# Altium footprint library SMPSProject.PcbLib: 143 footprints (part 4 of 9)
Each footprint in its own frame and in the unit in brackets; x right, y up, seen from the top. Pads: shape width x height; smd on the part's side, far side on the other; paste and mask are expansions set on the pad; w line width, h text height; cw(c..) or ccw(c..) is an arc to the next point about the centre after c.
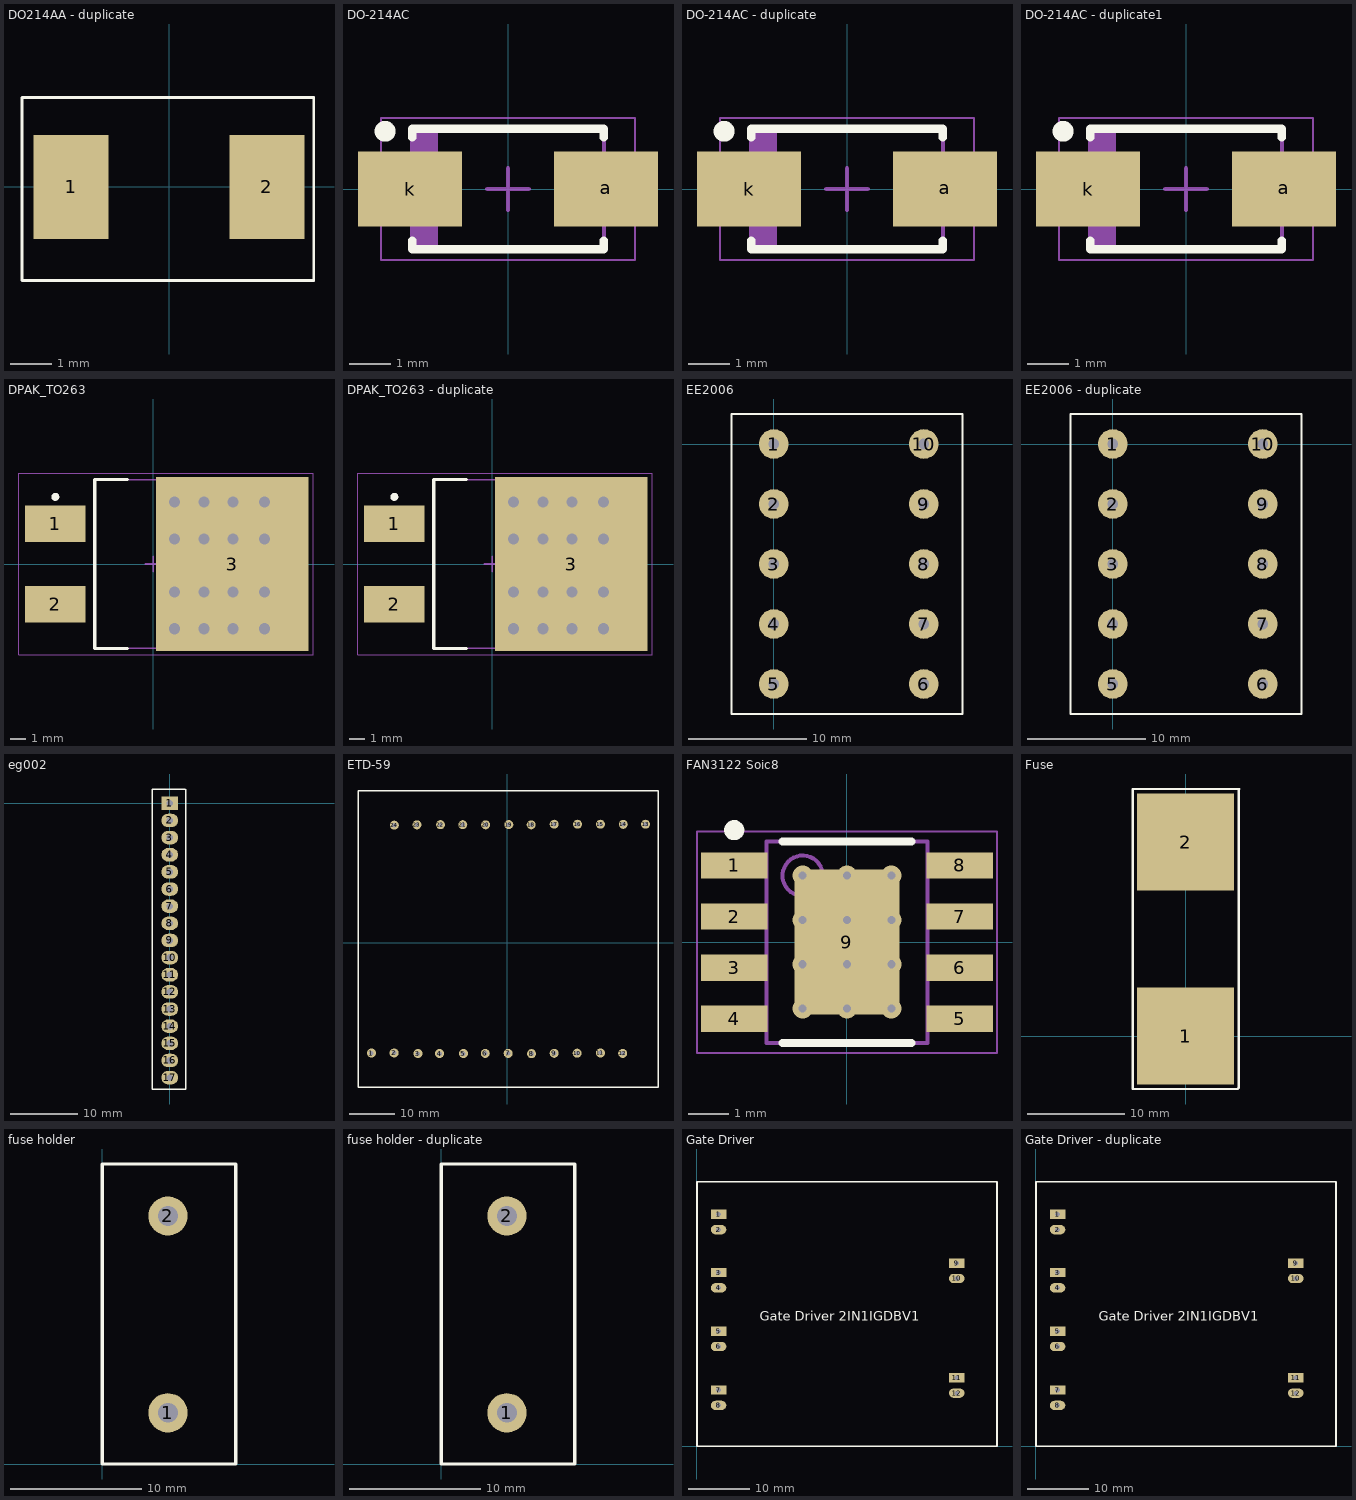
[diagram p3: the footprints below, top view; thin cyan lines are the x and y axes]

## DO214AA - duplicate [mm]
pads (2):
  rect 1.8x2.5 smd: 1(-2.35,0) 2(2.35,0)
Top Overlay:
  lines w0.07: -3.525,-2.25 -3.525,1.025 -3.525,2.15 3.475,2.15 3.475,-2.25 -3.525,-2.25
3D body "User Library-DO-214AA(SMB).STEP": height 2.48, standoff -0.35, extent -2.84,-2.025 2.838,1.925

## DO-214AC [mm]
height 1.35
pads (2):
  rect 2.5x1.8 smd: a(2.35,0) k(-2.35,0)
Top Overlay:
  circle w0.25: c-2.95,1.385 r0.125
  lines w0.2: -2.3,-1.235 -2.3,-1.45 2.3,-1.45 2.3,-1.235 ; -2.3,1.235 -2.3,1.45 2.3,1.45 2.3,1.235
Top Courtyard:
  lines w0.05: -3.05,-1.7 -3.05,1.7 3.05,1.7 3.05,-1.7 -3.05,-1.7
  lines w0.1: -0.5,0 0.5,0 ; 0,-0.5 0,0.5
Top Assembly:
  rectangle: -2.3,-1.45 -1.681,1.45
  lines w0.1: -2.3,-1.45 -2.3,1.45 2.3,1.45 2.3,-1.45 -2.3,-1.45
3D body "User Library-DO-214AC(SMA).STEP": height 2.3, standoff 0.01, extent -2.768,-1.422 2.718,1.372

## DO-214AC - duplicate [mm]
height 1.35
pads (2):
  rect 2.5x1.8 smd: a(2.35,0) k(-2.35,0)
Top Overlay:
  circle w0.25: c-2.95,1.385 r0.125
  lines w0.2: -2.3,-1.235 -2.3,-1.45 2.3,-1.45 2.3,-1.235 ; -2.3,1.235 -2.3,1.45 2.3,1.45 2.3,1.235
Top Courtyard:
  lines w0.05: -3.05,-1.7 -3.05,1.7 3.05,1.7 3.05,-1.7 -3.05,-1.7
  lines w0.1: -0.5,0 0.5,0 ; 0,-0.5 0,0.5
Top Assembly:
  rectangle: -2.3,-1.45 -1.681,1.45
  lines w0.1: -2.3,-1.45 -2.3,1.45 2.3,1.45 2.3,-1.45 -2.3,-1.45
3D body "User Library-DO-214AC(SMA).STEP": height 2.3, standoff 0.01, extent -2.768,-1.422 2.718,1.372

## DO-214AC - duplicate1 [mm]
height 1.35
pads (2):
  rect 2.5x1.8 smd: a(2.35,0) k(-2.35,0)
Top Overlay:
  circle w0.25: c-2.95,1.385 r0.125
  lines w0.2: -2.3,-1.235 -2.3,-1.45 2.3,-1.45 2.3,-1.235 ; -2.3,1.235 -2.3,1.45 2.3,1.45 2.3,1.235
Top Courtyard:
  lines w0.05: -3.05,-1.7 -3.05,1.7 3.05,1.7 3.05,-1.7 -3.05,-1.7
  lines w0.1: -0.5,0 0.5,0 ; 0,-0.5 0,0.5
Top Assembly:
  rectangle: -2.3,-1.45 -1.681,1.45
  lines w0.1: -2.3,-1.45 -2.3,1.45 2.3,1.45 2.3,-1.45 -2.3,-1.45
3D body "User Library-DO-214AC(SMA).STEP": height 2.3, standoff 0.01, extent -2.768,-1.422 2.718,1.372

## DPAK_TO263 [mm] "D2-PAK, 3-Pads, Body 7.93x8.70mm (max), IPC Medium Density"
height 4.8
pads (3):
  rect 3.81x2.32 smd: 1(-6.2,2.54) 2(-6.2,-2.54)
  rect 9.65x11 smd: 3(5,0)
via 1.35,3.925 diameter 1.27 hole 0.711
via 3.225,3.925 diameter 1.27 hole 0.711
via 5.05,3.925 diameter 1.27 hole 0.711
via 7.05,3.925 diameter 1.27 hole 0.711
via 1.35,1.575 diameter 1.27 hole 0.711
via 3.225,1.575 diameter 1.27 hole 0.711
via 5.05,1.575 diameter 1.27 hole 0.711
via 7.05,1.575 diameter 1.27 hole 0.711
via 1.35,-1.775 diameter 1.27 hole 0.711
via 3.225,-1.775 diameter 1.27 hole 0.711
via 5.05,-1.775 diameter 1.27 hole 0.711
via 7.05,-1.775 diameter 1.27 hole 0.711
via 1.35,-4.1 diameter 1.27 hole 0.711
via 3.225,-4.1 diameter 1.27 hole 0.711
via 5.05,-4.1 diameter 1.27 hole 0.711
via 7.05,-4.1 diameter 1.27 hole 0.711
Top Overlay:
  circle w0.25: c-6.2,4.25 r0.125
  lines w0.2: -1.625,-5.35 -3.7,-5.35 -3.7,5.35 -1.625,5.35
Top Courtyard:
  lines w0.05: -8.5,-5.75 10.125,-5.75 10.125,5.75 -8.5,5.75 -8.5,-5.75
  lines w0.1: -0.5,0 0.5,0 ; 0,-0.5 0,0.5
Top Assembly:
  lines w0.1: -3.7,-5.325 5.95,-5.325 5.95,5.325 -3.7,5.325 -3.7,-5.325
3D body "User Library-TO263-3S.STEP": height 4.81, standoff 0.01, extent -7.515,-4.975 8.155,5.025

## DPAK_TO263 - duplicate [mm] "D2-PAK, 3-Pads, Body 7.93x8.70mm (max), IPC Medium Density"
height 4.8
pads (3):
  rect 3.81x2.32 smd: 1(-6.2,2.54) 2(-6.2,-2.54)
  rect 9.65x11 smd: 3(5,0)
via 1.35,3.925 diameter 1.27 hole 0.711
via 3.225,3.925 diameter 1.27 hole 0.711
via 5.05,3.925 diameter 1.27 hole 0.711
via 7.05,3.925 diameter 1.27 hole 0.711
via 1.35,1.575 diameter 1.27 hole 0.711
via 3.225,1.575 diameter 1.27 hole 0.711
via 5.05,1.575 diameter 1.27 hole 0.711
via 7.05,1.575 diameter 1.27 hole 0.711
via 1.35,-1.775 diameter 1.27 hole 0.711
via 3.225,-1.775 diameter 1.27 hole 0.711
via 5.05,-1.775 diameter 1.27 hole 0.711
via 7.05,-1.775 diameter 1.27 hole 0.711
via 1.35,-4.1 diameter 1.27 hole 0.711
via 3.225,-4.1 diameter 1.27 hole 0.711
via 5.05,-4.1 diameter 1.27 hole 0.711
via 7.05,-4.1 diameter 1.27 hole 0.711
Top Overlay:
  circle w0.25: c-6.2,4.25 r0.125
  lines w0.2: -1.625,-5.35 -3.7,-5.35 -3.7,5.35 -1.625,5.35
Top Courtyard:
  lines w0.05: -8.5,-5.75 10.125,-5.75 10.125,5.75 -8.5,5.75 -8.5,-5.75
  lines w0.1: -0.5,0 0.5,0 ; 0,-0.5 0,0.5
Top Assembly:
  lines w0.1: -3.7,-5.325 5.95,-5.325 5.95,5.325 -3.7,5.325 -3.7,-5.325
3D body "User Library-TO263-3S.STEP": height 4.81, standoff 0.01, extent -7.515,-4.975 8.155,5.025

## EE2006 [mm]
pads (10):
  round 2.5 hole 0.9: 1(0,0) 2(0,-5.08) 3(0,-10.16) 4(0,-15.24) 5(0,-20.32) 6(12.7,-20.32) 7(12.7,-15.24) 8(12.7,-10.16) 9(12.7,-5.08) 10(12.7,0)
Top Overlay:
  lines w0.2: -3.575,-22.86 -3.575,2.54 5.08,2.54 7.62,2.54 15.975,2.54 15.975,-22.86 -3.575,-22.86

## EE2006 - duplicate [mm]
pads (10):
  round 2.5 hole 0.9: 1(0,0) 2(0,-5.08) 3(0,-10.16) 4(0,-15.24) 5(0,-20.32) 6(12.7,-20.32) 7(12.7,-15.24) 8(12.7,-10.16) 9(12.7,-5.08) 10(12.7,0)
Top Overlay:
  lines w0.2: -3.575,-22.86 15.975,-22.86 15.975,2.54 7.62,2.54 5.08,2.54 -3.575,2.54 -3.575,-22.86

## eg002 [mm]
pads (17):
  rect 2.5x2 hole 1: 1(0,0)
  oval 2.5x2 hole 1: 2(0,-2.54) 3(0,-5.08) 4(0,-7.62) 5(0,-10.16) 6(0,-12.7) 7(0,-15.24) 8(0,-17.78) 9(0,-20.32) 10(0,-22.86) 11(0,-25.4) 12(0,-27.94) 13(0,-30.48) 14(0,-33.02) 15(0,-35.56) 16(0,-38.1) 17(0,-40.64)
Top Overlay:
  lines w0.2: 2.315,2.12 -2.565,2.12 -2.565,-42.325 2.35,-42.325 2.35,2.12
3D body "SPWM Controller.step": height 34.09, standoff -6.79, extent -4.975,-41.283 1.315,5.583

## ETD-59 [mm]
pads (24):
  round 2 hole 1: 1(-30.175,-24.536) 2(-25.146,-24.511) 3(-19.837,-24.638) 4(-15.037,-24.638) 5(-9.728,-24.638) 6(-4.877,-24.613) 7(0.203,-24.613) 8(5.41,-24.663) 9(10.439,-24.587) 10(15.545,-24.562) 11(20.726,-24.511) 12(25.679,-24.613) 13(30.759,26.34) 14(25.806,26.314) 15(20.726,26.34) 16(15.646,26.34) 17(10.439,26.34) 18(5.334,26.213) 19(0.356,26.264) 20(-4.801,26.213) 21(-9.881,26.238) 22(-14.834,26.238) 23(-20.066,26.213) 24(-25.095,26.137)
Top Overlay:
  lines w0.3: -33.172,-32.08 -33.172,33.833 33.528,33.833 33.528,-32.08 33.426,-32.182 -33.071,-32.182 -33.172,-32.08
3D body "User Library-ETD59.STEP": height 44.98, standoff -8.02, extent -33.122,-32.237 33.778,33.862

## FAN3122 Soic8 [mm] "SOIC, 8-Leads, Body 4.95x3.95mm, Pitch 1.27mm, Thermal Pad 4.10x3.10mm, IPC Medium Density"
height 1.75
pads (9):
  rect 1.65x0.65 smd: 1(-2.8,1.905) 2(-2.8,0.635) 3(-2.8,-0.635) 4(-2.8,-1.905) 5(2.8,-1.905) 6(2.8,-0.635) 7(2.8,0.635) 8(2.8,1.905)
  rect 2.6x3.6 smd: 9(0,0)
via -1.1,1.65 diameter 0.5 hole 0.2
via 0,1.65 diameter 0.5 hole 0.2
via 1.1,1.65 diameter 0.5 hole 0.2
via -1.1,0.55 diameter 0.5 hole 0.2
via 0,0.55 diameter 0.5 hole 0.2
via 1.1,0.55 diameter 0.5 hole 0.2
via -1.1,-0.55 diameter 0.5 hole 0.2
via 0,-0.55 diameter 0.5 hole 0.2
via 1.1,-0.55 diameter 0.5 hole 0.2
via -1.1,-1.65 diameter 0.5 hole 0.2
via 0,-1.65 diameter 0.5 hole 0.2
via 1.1,-1.65 diameter 0.5 hole 0.2
Top Overlay:
  circle w0.25: c-2.8,2.78 r0.125
  lines w0.2: -1.6,-2.5 1.6,-2.5 ; -1.6,2.5 1.6,2.5
Top Courtyard:
  lines w0.05: -3.725,-2.75 -3.725,2.75 3.725,2.75 3.725,-2.75 -3.725,-2.75
  lines w0.1: -0.5,0 0.5,0 ; 0,-0.5 0,0.5
Top Assembly:
  circle w0.1: c-1.1,1.65 r0.5
  lines w0.1: -2,-2.5 -2,2.5 2,2.5 2,-2.5 -2,-2.5
3D body "User Library-SOIC8_JEDEC_MS-012AA.STEP": height 1.66, standoff -0.09, extent -3.124,-2.55 3.075,2.45

## Fuse [mm]
pads (2):
  rect 10x10 smd: 1(0,0) 2(0,20)
Top Overlay:
  lines w0.254: -5.425,-5.425 -5.425,25.475 5.525,25.475 5.475,25.425 5.475,-5.325 5.35,-5.45 -5.4,-5.45 -5.425,-5.425

## fuse holder [mm]
pads (2):
  round 3 hole 1.5: 1(5,3.9) 2(5,18.9)
Top Overlay:
  lines w0.254: 0,0 10.16,0 10.16,22.86 9.906,22.86 0,22.86 0,0

## fuse holder - duplicate [mm]
pads (2):
  round 3 hole 1.5: 1(5,3.9) 2(5,18.9)
Top Overlay:
  lines w0.254: 0,0 0,22.86 9.906,22.86 10.16,22.86 10.16,0 0,0

## Gate Driver [mm]
pads (12):
  rect 2.524x1.524 hole 0.762 square: 1(3.525,37.9) 3(3.525,28.4) 5(3.525,18.825) 7(3.525,9.2) 9(42.425,29.925) 11(42.425,11.2)
  oval 2.524x1.524 hole 0.762 square: 2(3.525,35.4) 4(3.525,25.9) 6(3.525,16.325) 8(3.525,6.7) 10(42.425,27.425) 12(42.425,8.7)
Top Overlay:
  lines w0.254: 0,0 0,43.25 49,43.25 49,0 0,0
  text "Gate Driver 2IN1IGDBV1" at 10.25,20.5 h1.52
3D body "Gate Driver Board.step": height 14.34, standoff -5.89, extent 0,0 49.1,43.25

## Gate Driver - duplicate [mm]
pads (12):
  rect 2.524x1.524 hole 0.762 square: 1(3.525,37.9) 3(3.525,28.4) 5(3.525,18.825) 7(3.525,9.2) 9(42.425,29.925) 11(42.425,11.2)
  oval 2.524x1.524 hole 0.762 square: 2(3.525,35.4) 4(3.525,25.9) 6(3.525,16.325) 8(3.525,6.7) 10(42.425,27.425) 12(42.425,8.7)
Top Overlay:
  lines w0.254: 0,0 0,43.25 49,43.25 49,0 0,0
  text "Gate Driver 2IN1IGDBV1" at 10.25,20.5 h1.52
3D body "Gate Driver Board.step": height 14.34, standoff -5.89, extent 0,0 49.1,43.25